# Altium footprint library MainFPs.PcbLib: 215 footprints (part 10 of 14)
Each footprint in its own frame and in the unit in brackets; x right, y up, seen from the top. Pads: shape width x height; smd on the part's side, far side on the other; paste and mask are expansions set on the pad; w line width, h text height; cw(c..) or ccw(c..) is an arc to the next point about the centre after c.
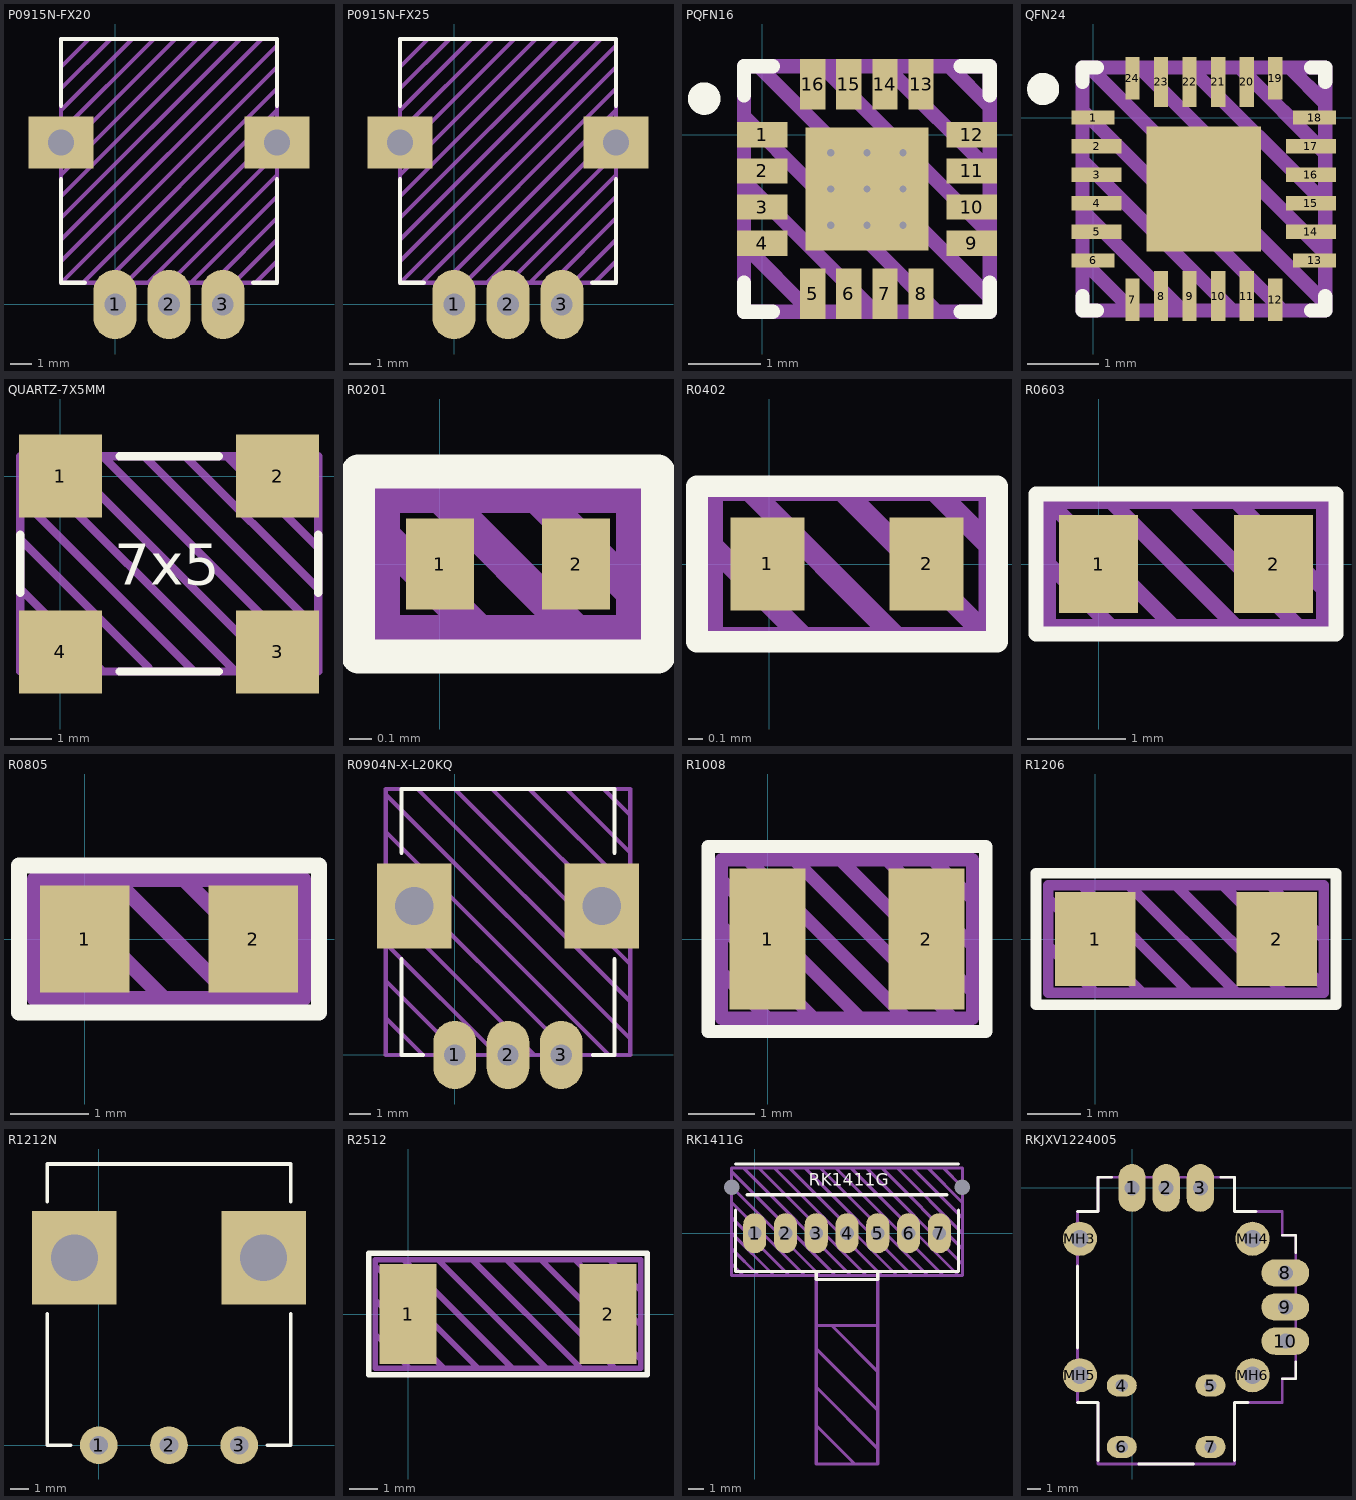
[diagram p9: the footprints below, top view; thin cyan lines are the x and y axes]

## P0915N-FX20 [mm] "Model P09x Series Potentiometer"
pads (5):
  oval 2x3.2 hole 1: 1(0,0) 2(2.5,0) 3(5,0)
  rect 3x2.4 hole 1.2 square: ""(-2.5,7.5) ""(7.5,7.5)
Top Overlay:
  lines w0.2: -2.5,5.8 -2.5,1 -1.4,1 ; -2.5,9.2 -2.5,12.3 7.5,12.3 7.5,9.2 ; 6.4,1 7.5,1 7.5,5.8
Top Draw:
  lines w0.2: -2.5,2 7.5,12 ; -2.5,3 6.8,12.3 ; -2.5,4 5.8,12.3 ; -2.5,5 4.8,12.3 ; -2.5,6 3.8,12.3 ; -2.5,7 2.8,12.3 ; -2.5,8 1.8,12.3 ; -2.5,9 0.8,12.3 ; -2.5,10 -0.2,12.3 ; -2.5,11 -1.2,12.3 ; -1.5,1 7.5,10 ; -0.5,1 7.5,9 ; 0.5,1 7.5,8 ; 1.5,1 7.5,7 ; 2.5,1 7.5,6 ; 3.5,1 7.5,5 ; 4.5,1 7.5,4 ; 5.5,1 7.5,3 ; 6.5,1 7.5,2 ; 7.5,11 -2.5,1 ; -2.5,1 7.5,1 7.5,12.3 -2.5,12.3 -2.5,1
Top Info:
  text "'.Comment'" at -2.811,-3.429 h1.25
3D body "P0915N-SC20B.step": height 30, standoff -3.3, extent -3.548,-0.15 8.548,12.35

## P0915N-FX25 [mm] "Model P09x Series Potentiometer"
pads (5):
  oval 2x3.2 hole 1: 1(0,0) 2(2.5,0) 3(5,0)
  rect 3x2.4 hole 1.2 square: ""(-2.5,7.5) ""(7.5,7.5)
Top Overlay:
  lines w0.2: -2.5,5.8 -2.5,1 -1.4,1 ; -2.5,9.2 -2.5,12.3 7.5,12.3 7.5,9.2 ; 6.4,1 7.5,1 7.5,5.8
Top Draw:
  lines w0.2: -2.5,2 7.5,12 ; -2.5,3 6.8,12.3 ; -2.5,4 5.8,12.3 ; -2.5,5 4.8,12.3 ; -2.5,6 3.8,12.3 ; -2.5,7 2.8,12.3 ; -2.5,8 1.8,12.3 ; -2.5,9 0.8,12.3 ; -2.5,10 -0.2,12.3 ; -2.5,11 -1.2,12.3 ; -1.5,1 7.5,10 ; -0.5,1 7.5,9 ; 0.5,1 7.5,8 ; 1.5,1 7.5,7 ; 2.5,1 7.5,6 ; 3.5,1 7.5,5 ; 4.5,1 7.5,4 ; 5.5,1 7.5,3 ; 6.5,1 7.5,2 ; 7.5,11 -2.5,1 ; -2.5,1 7.5,1 7.5,12.3 -2.5,12.3 -2.5,1
Top Info:
  text "'.Comment'" at -2.811,-3.429 h1.25
3D body "P0915N-SC25B.step": height 35, standoff -3.3, extent -3.548,-0.15 8.548,12.35

## PQFN16 [mm]
height 0.8
pads (17):
  rect 0.7x0.35 smd: 1(0,0) 2(0,-0.5) 3(0,-1) 4(0,-1.5) 9(2.9,-1.5) 10(2.9,-1) 11(2.9,-0.5) 12(2.9,0)
  rect 0.35x0.7 smd: 5(0.7,-2.2) 6(1.2,-2.2) 7(1.7,-2.2) 8(2.2,-2.2) 13(2.2,0.7) 14(1.7,0.7) 15(1.2,0.7) 16(0.7,0.7)
  rect 1.7x1.7 smd: ""(1.45,-0.75)
via 1.45,-0.75 diameter 0.3 hole 0.1
via 0.95,-0.75 diameter 0.3 hole 0.1
via 1.95,-0.75 diameter 0.3 hole 0.1
via 1.95,-0.25 diameter 0.3 hole 0.1
via 1.45,-0.25 diameter 0.3 hole 0.1
via 0.95,-0.25 diameter 0.3 hole 0.1
via 0.95,-1.25 diameter 0.3 hole 0.1
via 1.45,-1.25 diameter 0.3 hole 0.1
via 1.95,-1.25 diameter 0.3 hole 0.1
Top Overlay:
  circle w0.25: c-0.8,0.5 r0.1
  lines w0.2: -0.25,-2.05 -0.25,-2.45 0.15,-2.45 ; -0.25,0.55 -0.25,0.95 0.15,0.95 ; 2.75,-2.45 3.15,-2.45 3.15,-2.05 ; 2.75,0.95 3.15,0.95 3.15,0.55
Top Draw:
  lines w0.2: -0.241,-1.537 0.66,-2.438 ; -0.241,-0.648 1.537,-2.426 ; -0.241,0.241 2.413,-2.438 ; -0.05,0.95 3.15,-2.25 ; 0.838,0.94 3.15,-1.372 ; 1.726,0.93 3.15,-0.494 3.15,-0.75 ; 2.615,0.919 3.139,0.395 ; -0.25,-2.45 3.15,-2.45 3.15,0.95 -0.25,0.95 -0.25,-2.45
Top Info:
  text "'.Comment'" at -0.381,-3.302 h0.5
3D body "PQFN16.step": height 0.8, standoff 0, extent -0.125,-2.325 3.025,0.825

## QFN24 [mm]
height 1
pads (25):
  rect 0.6x0.2 smd: 1(0,0) 6(0,-2) 13(3.1,-2) 18(3.1,0)
  rect 0.7x0.2 smd: 2(0.05,-0.4) 3(0.05,-0.8) 4(0.05,-1.2) 5(0.05,-1.6) 14(3.05,-1.6) 15(3.05,-1.2) 16(3.05,-0.8) 17(3.05,-0.4)
  rect 0.2x0.6 smd: 7(0.55,-2.55) 12(2.55,-2.55) 19(2.55,0.55) 24(0.55,0.55)
  rect 0.2x0.7 smd: 8(0.95,-2.5) 9(1.35,-2.5) 10(1.75,-2.5) 11(2.15,-2.5) 20(2.15,0.5) 21(1.75,0.5) 22(1.35,0.5) 23(0.95,0.5)
  rect 1.6x1.75 smd: ""(1.55,-1)
Top Overlay:
  circle w0.25: c-0.7,0.4 r0.1
  lines w0.2: -0.15,-2.5 -0.15,-2.7 0.05,-2.7 ; -0.15,0.5 -0.15,0.7 0.05,0.7 ; 3.05,-2.7 3.25,-2.7 3.25,-2.5 ; 3.05,0.7 3.25,0.7 3.25,0.5
Top Draw:
  lines w0.2: -0.15,-2 0.55,-2.7 ; -0.15,-1.3 1.25,-2.7 ; -0.15,-0.6 1.95,-2.7 ; -0.15,0.1 2.65,-2.7 ; -0.05,0.7 3.25,-2.6 ; 0.65,0.7 3.25,-1.9 ; 1.35,0.7 3.25,-1.2 ; 2.05,0.7 3.25,-0.5 ; 2.75,0.7 3.25,0.2 ; -0.15,-2.7 3.25,-2.7 3.25,0.7 -0.15,0.7 -0.15,-2.7
Top Info:
  text "'.Comment'" at -0.574,-3.692 h0.5
3D body "QFN24.step": height 1, standoff 0, extent -0.01,-2.56 3.11,0.56

## QUARTZ-7X5MM [mm]
pads (4):
  rect 2x2 smd: 1(0,0) 2(5.25,0) 3(5.25,-4.25) 4(0,-4.25)
Top Overlay:
  lines w0.2: -0.971,-2.821 -0.971,-1.421 ; 1.429,-4.721 3.829,-4.721 ; 1.429,0.479 3.829,0.479 ; 6.229,-2.821 6.229,-1.421
  text "7x5" at 1.296,-2.621 h1
Top Draw:
  lines w0.2: -0.971,-3.721 0.029,-4.721 ; -0.971,-2.721 1.029,-4.721 ; -0.971,-1.521 2.129,-4.621 ; -0.971,-0.521 3.229,-4.721 ; 0.029,0.479 5.229,-4.721 ; 1.029,0.479 6.229,-4.721 ; 2.029,0.479 6.229,-3.721 ; 3.029,0.479 6.229,-2.721 ; 4.029,0.479 6.229,-1.721 ; 4.229,-4.721 -0.971,0.479 ; 5.029,0.479 6.229,-0.721 ; -0.971,0.479 6.229,0.479 6.229,-4.721 ; -0.971,0.479 -0.971,-4.721 6.229,-4.721
Top Info:
  text "'.Comment'" at -1.62,-6.704 h1
3D body: height 1.7, standoff 1.5, extent -0.991,-4.75 6.248,0.508
3D body: height 2, standoff 1.7, extent -0.749,-4.496 6.007,0.254
3D body: height 1.5, standoff 0.1, extent -0.991,-4.75 6.248,0.508

## R0201 [mm]
height 0.3
pads (2):
  rect 0.3x0.4 smd: 1(0,0) 2(0.6,0)
Top Overlay:
  lines w0.15: -0.36,-0.406 -0.36,0.406 0.96,0.406 0.96,0.381 0.96,-0.406 -0.36,-0.406
Top Draw:
  lines w0.15: -0.25,0.125 0.175,-0.3 ; 0,0.3 0.6,-0.3 ; 0.425,0.3 0.85,-0.125 ; -0.25,-0.3 0.85,-0.3 0.85,0.3 -0.25,0.3 -0.25,-0.3
Top Info:
  text "'.Comment'" at -0.762,-0.846 h0.25
3D body "Chip2PinSM127P600-8N.step": height 0.25, standoff 0, extent 0,-0.15 0.6,0.15

## R0402 [mil]
pads (2):
  rect 20x25 smd: 1(-0.47,0.04) 2(42.53,0.04)
Top Overlay:
  lines w5.91: -19.47,-20.96 61.53,-20.96 61.53,21.04 -19.47,21.04 -19.47,-20.96
Top Draw:
  lines w5.91: -15.47,5.04 9.53,-19.96 ; -5.47,20.04 34.53,-19.96 ; 19.53,20.04 59.53,-19.96 ; 44.53,20.04 59.53,5.04 ; 59.53,-19.96 -15.47,-19.96 -15.47,20.04 59.53,20.04 59.53,-19.96
Top Info:
  text "'.Comment'" at -38.86,-43.47 h13.78
3D body "RESC1005X04N.step": height 15.75, standoff 0, extent -0.47,-10.4 40.47,10.46

## R0603 [mm]
pads (2):
  rect 0.8x1 smd: 1(0,0) 2(1.778,0)
Top Overlay:
  lines w0.15: -0.635,-0.711 2.413,-0.711 2.413,0.711 -0.635,0.711 -0.635,-0.711
Top Draw:
  lines w0.15: -0.508,0 0.127,-0.635 ; 0.127,0.635 1.397,-0.635 ; 0.762,-0.635 -0.508,0.635 ; 0.762,0.635 2.032,-0.635 ; 1.397,0.635 2.286,-0.254 ; -0.508,0.635 2.286,0.635 2.286,-0.635 -0.508,-0.635 -0.508,0.635
Top Info:
  text "'.Comment'" at -1.224,-1.492 h0.5
3D body "Chip2PinSM127P600-8N.step": height 0.5, standoff 0, extent 0.104,-0.395 1.674,0.395

## R0805 [mil]
pads (2):
  rect 45x54 smd: 1(0,0) 2(85,0)
Top Overlay:
  lines w7.87: -33,-37 118,-37 118,37 -33,37 -33,-37
Top Draw:
  lines w7.87: -25,0 5,-30 ; -20,30 40,-30 ; 15,30 75,-30 ; 35,-30 42.5,-30 ; 50,30 110,-30 ; 85,30 110,5 ; 110,-30 -25,-30 -25,30 110,30 110,-30
Top Info:
  text "'.Comment'" at -82.14,-84.15 h29.53
3D body: height 24.02, standoff 23.62, extent 2.06,-25.98 83.95,25.99
3D body "Chip2PinSM127P600-8N999.step": height 23.62, standoff 0, extent 2.06,-25.98 83.95,25.99

## R0904N-X-L20KQ [mm] "R0904N Family Potentiometer"
pads (5):
  oval 2x3.2 hole 1: 1(0,0) 2(2.5,0) 3(5,0)
  rect 3.5x4 hole 1.8 square: ""(-1.9,7) ""(6.9,7)
Top Overlay:
  lines w0.2: -2.5,4.5 -2.5,0 -1.5,0 ; -2.5,9.5 -2.5,12.5 7.5,12.5 7.5,9.5 ; 6.5,0 7.5,0 7.5,4.5
Top Draw:
  lines w0.2: -3.25,1.75 -1.5,0 ; -3.25,3.5 0.25,0 ; -3.25,5.25 2,0 ; -3.25,7 3.75,0 ; -3.25,8.75 5.5,0 ; -3.25,10.5 7.25,0 ; -3.25,12.25 8.25,0.75 ; -1.75,12.5 8.25,2.5 ; 0,12.5 8.25,4.25 ; 1.75,12.5 8.25,6 ; 3.5,12.5 8.25,7.75 ; 5.25,12.5 8.25,9.5 ; 7,12.5 8.25,11.25 ; -3.25,0 -3.25,12.5 8.25,12.5 8.25,0 -3.25,0
Top Info:
  text "'.Comment'" at -1.749,-3.083 h1
3D body "R0904N-L-20KQ.stp": height 20, standoff -3.79, extent -3.2,-0.15 8.2,12.5

## R1008 [mm]
pads (2):
  rect 1.15x2.14 smd: 1(0,0) 2(2.4,0)
Top Overlay:
  lines w0.2: -0.9,-1.4 -0.9,1.4 3.3,1.4 3.3,-1.4 -0.9,-1.4
Top Draw:
  lines w0.2: -0.7,-0.5 0,-1.2 ; -0.7,0.2 0.7,-1.2 ; -0.7,0.9 1.4,-1.2 ; -0.3,1.2 2.1,-1.2 ; 0.4,1.2 2.8,-1.2 ; 1.1,1.2 3.1,-0.8 ; 1.8,1.2 3.1,-0.1 ; 2.5,1.2 3.1,0.6 ; -0.7,-1.2 -0.7,1.2 3.1,1.2 3.1,-1.2 -0.7,-1.2
Top Info:
  text "'.Comment'" at -1.986,-2.537 h0.75
3D body "RESC2520X09N.step": height 0.9, standoff 0, extent -0.05,-1 2.45,1

## R1206 [mil]
pads (2):
  rect 60x70 smd: 1(0,0) 2(135,0)
Top Overlay:
  lines w7.87: -44,-49 -44,49 179,49 179,-49 -44,-49
Top Draw:
  lines w7.87: -35,-5 0,-40 ; -35,30 35,-40 ; -10,40 70,-40 ; 25,40 105,-40 ; 60,40 140,-40 ; 95,40 170,-35 ; 130,40 170,0 ; -35,-40 -35,40 170,40 170,-40 -35,-40
Top Info:
  text "'.Comment'" at -58.52,-95.96 h29.53
3D body "Chip2PinSM127P600-8Nr.step": height 27.56, standoff 0, extent 6.11,-31.03 128.94,30.78

## R1212N [mm]
pads (5):
  round 2 hole 1: 1(0,0) 2(3.75,0) 3(7.5,0)
  rect 4.5x5 hole 2.5 square: ""(-1.3,10) ""(8.8,10)
Top Overlay:
  lines w0.2: -2.75,7 -2.75,0 -1.5,0 ; -2.75,13 -2.75,15 -2.25,15 10.25,15 10.25,13 ; 9,0 10.25,0 10.25,7
Top Info:
  text "'.Comment'" at -0.499,-2.583 h1

## R2512 [mm]
pads (2):
  rect 2x3.5 smd: 1(0,0) 2(7,0)
Top Overlay:
  lines w0.2: -1.375,-2.125 -1.375,2.125 8.375,2.125 8.375,-2.125 -1.375,-2.125
Top Draw:
  lines w0.2: -1.15,-0.7 0.05,-1.9 ; -1.15,0.5 1.25,-1.9 ; -1.15,1.7 2.45,-1.9 ; -0.15,1.9 3.65,-1.9 ; 1.05,1.9 4.85,-1.9 ; 2.25,1.9 6.05,-1.9 ; 3.45,1.9 7.25,-1.9 ; 4.65,1.9 8.15,-1.6 ; 5.85,1.9 8.15,-0.4 ; 7.05,1.9 8.15,0.8 ; -1.15,-1.9 8.15,-1.9 8.15,1.9 -1.15,1.9 -1.15,-1.9
Top Info:
  text "'.Comment'" at -0.749,-3.583 h1
3D body "RES2512.stp": height 0.55, standoff 0, extent 0.325,-1.6 6.675,1.6
3D body: height 0.55, standoff 0.5, extent 0.825,-1.58 6.175,1.58

## RK1411G [mm]
pads (9):
  oval 1.5x2.6 hole 0.9: 1(0,0) 2(2,0) 3(4,0) 4(6,0) 5(8,0) 6(10,0) 7(12,0)
  round 0 hole 1 square: 7(-1.5,3) 7(13.5,3)
Top Overlay:
  lines w0.2: -1.25,1.5 -1.25,-2.5 13.25,-2.5 13.25,1.5 ; -1.25,4.5 13.25,4.5 ; -0.5,2.5 12.5,2.5 ; 4,-2.5 4,-3 8,-3 8,-2.5
  text "RK1411G" at 3.5,3.1 h0.8
Top Draw:
  lines w0.2: -1.5,-2 -0.75,-2.75 -0.5,-2.75 ; -1.5,-1 0.25,-2.75 1,-2.75 ; -1.5,0 1.25,-2.75 3,-2.75 ; -1.5,1 2.25,-2.75 4,-2.75 3.25,-2.75 -1.5,2 ; -1.5,3 4.25,-2.75 5,-2.75 ; -1.5,4 5,-2.5 5.25,-2.75 ; -0.75,4.25 6.25,-2.75 7,-2.75 ; 0.25,4.25 7.25,-2.75 9,-2.75 8.25,-2.75 1.25,4.25 ; 2.25,4.25 9.25,-2.75 10,-2.75 ; 3.25,4.25 10.25,-2.75 12,-2.75 11.25,-2.75 4.25,4.25 ; 4,-12.5 6.5,-15 7.5,-15 ; 4,-10 8,-14 ; 4,-7.5 8,-11.5 ; 4,-6 8,-6 ; 4,-2.5 4,-15 8,-15 ; 5,-6 8,-9 8,-11.5 ; 5.25,4.25 12.25,-2.75 13.5,-2.75 ; 6.25,4.25 13.25,-2.75 13.5,-2.75 ; 7.25,4.25 13.5,-2 ; 8,-2.5 8,-15 ; 8.25,4.25 13.5,-1 ; 9.25,4.25 13.5,0 13.5,-1 ; 10.25,4.25 13.5,1 ; 11.25,4.25 13.5,2 13.5,-1 ; 12.25,4.25 13.5,3 ; 13.5,-2.5 13.5,-2 ; 8,-15 8,-14 ; 8,-14 8,-11.5 ; 13.5,-2.75 13.5,4.25 -1.5,4.25 -1.5,-2.75 13.5,-2.75 ; 13.5,-2 13.5,-1 ; 13.5,3 13.5,3
Top Info:
  text "'.Comment'" at 2.54,-16.51 h1
3D body: height 4, standoff 1, extent 13.5,1.5 13.75,4.4
3D body: height 12.5, standoff 1, extent -1.75,-1.5 -1.5,1.5
3D body: height 5, standoff 2, extent -1.75,-2.25 -1.5,-1.5
3D body: height 12, standoff 9, extent -1.75,-2.25 -1.5,-1.5
3D body: height 5, standoff 2, extent 13,-2.25 13.75,-2
3D body: height 13, standoff 1, extent -1,-2.25 13,-2
3D body: height 11, standoff 3, extent 2,-3 10,-2
3D body: height 14, standoff 0.1, extent -1.5,-2 13.5,2
3D body: height 10.5, standoff 3.5, extent 2.5,-15 9.5,-2
3D body: height 12, standoff 9, extent 13,-2.25 13.75,-2
3D body: height 12, standoff 9, extent -1.75,-2.25 -1,-2
3D body: height 5, standoff 2, extent -1.75,-2.25 -1,-2
3D body: height 12, standoff 9, extent 13.5,-2.25 13.75,-1.5
3D body: height 5, standoff 2, extent 13.5,-2.25 13.75,-1.5
3D body: height 12.5, standoff 1, extent 13.5,-1.5 13.75,1.5
3D body: height 2, standoff -2.54, extent 13.5,2.3 13.75,3.9
3D body: height 2, standoff -2.54, extent -1.75,2.3 -1.5,3.9
3D body: height 4, standoff 1, extent -1.75,1.5 -1.5,4.4
3D body: height 1, standoff -1.78, extent -0.35,-0.15 0.35,0.15
3D body: height 1, standoff -1.78, extent 1.65,-0.15 2.35,0.15
3D body: height 1, standoff -1.78, extent 3.65,-0.15 4.35,0.15
3D body: height 1, standoff -1.78, extent 5.65,-0.15 6.35,0.15
3D body: height 1, standoff -1.78, extent 7.65,-0.15 8.35,0.15
3D body: height 1, standoff -1.78, extent 9.65,-0.15 10.35,0.15
3D body: height 1, standoff -1.78, extent 11.65,-0.15 12.35,0.15

## RKJXV1224005 [mm] "PS5 Analog Joystick"
pads (14):
  oval 2x3.5 hole 1.1: 1(0,0) 2(2.5,0) 3(5,0)
  oval 2.2x1.6 hole 0.9: 4(-0.75,-14.48) 5(5.75,-14.48) 6(-0.75,-18.98) 7(5.75,-18.98)
  oval 3.5x2 hole 1.1: 8(11.23,-6.23) 9(11.23,-8.73) 10(11.23,-11.23)
  round 2.5 hole 1.3: MH3(-3.825,-3.73) MH4(8.825,-3.73) MH5(-3.825,-13.73) MH6(8.825,-13.73)
Top Overlay:
  lines w0.2: -4,-15.73 -2.5,-15.73 -2.5,-19.98 ; -4,-11.73 -4,-5.73 ; -4,-1.73 -2.5,-1.73 -2.5,0.77 -1.5,0.77 ; 0.5,-20.23 4.5,-20.23 ; 6.5,0.77 7.5,0.77 7.5,-1.73 9.075,-1.73 ; 7.5,-19.98 7.5,-15.73 8.5,-15.73 ; 11,-13.98 12,-13.98 12,-12.73 ; 11,-3.48 12,-3.48 12,-4.73
Top Draw:
  lines w0.2: -4,-15.73 -2.5,-15.73 -2.5,-20.23 7.5,-20.23 7.5,-15.73 11,-15.73 11,-13.98 12,-13.98 12,-3.48 11,-3.48 11,-1.73 7.5,-1.73 7.5,0.77 -2.5,0.77 -2.5,-1.73 -4,-1.73 -4,-15.73
Top Info:
  text "'.Comment'" at -3.75,-22.48 h1.5
3D body "Joystick.stp": height 19.08, standoff -2.92, extent -4.026,-20.217 11.924,0.633